# Altium footprint library Dr.Xiong_20160818.PcbLib: 266 footprints (part 15 of 17)
Each footprint in its own frame and in the unit in brackets; x right, y up, seen from the top. Pads: shape width x height; smd on the part's side, far side on the other; paste and mask are expansions set on the pad; w line width, h text height; cw(c..) or ccw(c..) is an arc to the next point about the centre after c.
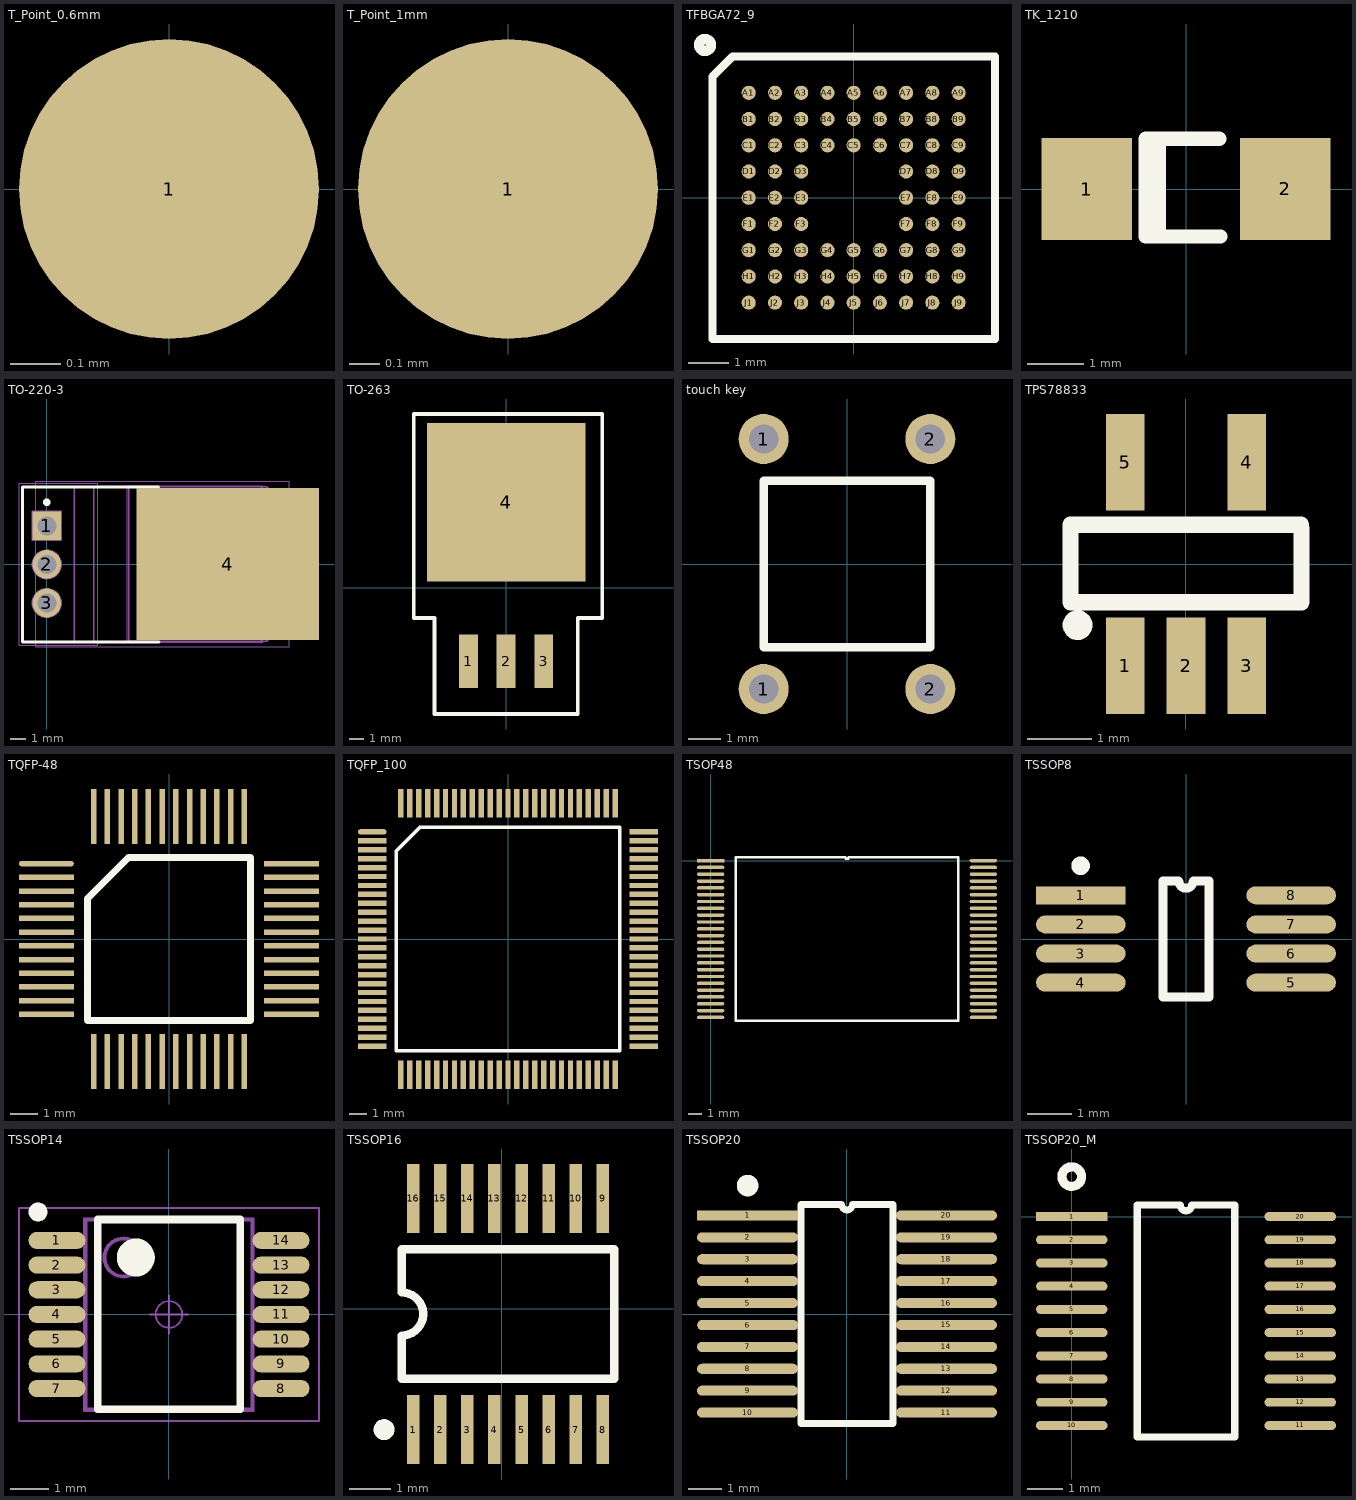
[diagram p14: the footprints below, top view; thin cyan lines are the x and y axes]

## T_Point_0.6mm [mm]
pads (1):
  round 0.6 all layers, no hole: 1(0,0)

## T_Point_1mm [mm]
pads (1):
  round 1 all layers, no hole: 1(0,0)

## TFBGA72_9 [mm]
pads (72):
  round 0.35 smd: A1(-2.6,2.6) A2(-1.95,2.6) A3(-1.3,2.6) A4(-0.65,2.6) A5(0,2.6) A6(0.65,2.6) A7(1.3,2.6) A8(1.95,2.6) A9(2.6,2.6) B1(-2.6,1.95) B2(-1.95,1.95) B3(-1.3,1.95) B4(-0.65,1.95) B5(0,1.95) B6(0.65,1.95) B7(1.3,1.95) B8(1.95,1.95) B9(2.6,1.95) C1(-2.6,1.3) C2(-1.95,1.3) C3(-1.3,1.3) C4(-0.65,1.3) C5(0,1.3) C6(0.65,1.3) C7(1.3,1.3) C8(1.95,1.3) C9(2.6,1.3) D1(-2.6,0.65) D2(-1.95,0.65) D3(-1.3,0.65) D7(1.3,0.65) D8(1.95,0.65) D9(2.6,0.65) E1(-2.6,0) E2(-1.95,0) E3(-1.3,0) E7(1.3,0) E8(1.95,0) E9(2.6,0) F1(-2.6,-0.65) F2(-1.95,-0.65) F3(-1.3,-0.65) F7(1.3,-0.65) F8(1.95,-0.65) F9(2.6,-0.65) G1(-2.6,-1.3) G2(-1.95,-1.3) G3(-1.3,-1.3) G4(-0.65,-1.3) G5(0,-1.3) G6(0.65,-1.3) G7(1.3,-1.3) G8(1.95,-1.3) G9(2.6,-1.3) H1(-2.6,-1.95) H2(-1.95,-1.95) H3(-1.3,-1.95) H4(-0.65,-1.95) H5(0,-1.95) H6(0.65,-1.95) H7(1.3,-1.95) H8(1.95,-1.95) H9(2.6,-1.95) J1(-2.6,-2.6) J2(-1.95,-2.6) J3(-1.3,-2.6) J4(-0.65,-2.6) J5(0,-2.6) J6(0.65,-2.6) J7(1.3,-2.6) J8(1.95,-2.6) J9(2.6,-2.6)
Top Overlay:
  circle w0.254: c-3.683,3.785 r0.148
  lines w0.2: -3.501,3.001 -3.002,3.5 ; -3.5,3 -3.5,-3.5 3.5,-3.5 3.5,3.5 -3,3.5

## TK_1210 [mm]
pads (2):
  rect 1.6x1.8 smd: 1(-1.75,0) 2(1.75,0)
Top Overlay:
  lines w0.254: -0.711,-0.838 -0.076,-0.838 ; -0.711,-0.787 -0.711,0.889 -0.102,0.889 0.305,0.889 ; -0.483,0.864 -0.483,-0.813 -0.457,-0.787 ; -0.102,-0.838 0.33,-0.838 ; 0.203,-0.838 0.61,-0.838 ; 0.279,0.889 0.584,0.889

## TO-220-3 [mm]
pads (4):
  rect 1.9x1.9 / inner round 1.9 / far side rect 1.9x1.9 hole 1.25: 1(0,2.54)
  round 1.9 hole 1.25: 2(0,0) 3(0,-2.54)
  rect 12x10 smd: 4(11.92,0.025)
Top Overlay:
  circle w0.25: c0,4.09 r0.125
  lines w0.2: 3.048,5.09 7.348,5.09 ; 3.1,5.09 -1.6,5.09 -1.6,-5.11 3.1,-5.11 7.4,-5.11
Mechanical 15:
  circle w0.1: c0,-2.54 r0.95
  circle w0.1: c0,0 r0.95
  lines w0.1: 1.82,-5.08 1.82,5.08 ; 14.11,-5.055 5.41,-5.055 5.41,5.105 14.11,5.105 ; 14.11,-5.055 14.11,5.105 ; 14.11,-5.055 14.48,-5.055 15.23,-4.224 15.23,4.274 14.48,5.105 14.11,5.105 ; -1.58,-5.08 -1.58,5.08 3.09,5.08 3.09,-5.08 -1.58,-5.08 ; -0.95,1.59 0.95,1.59 0.95,3.49 -0.95,3.49 -0.95,1.59
Mechanical 16:
  circle w0.05: c0,2.54 r0.35
  circle w0.05: c7.62,0.025 r0.35
  lines w0.001: -1.58,-5.08 -1.58,5.08 3.09,5.08 3.09,-5.08 -1.58,-5.08 ; 5.31,-5.13 14.21,-5.13 14.21,5.18 5.31,5.18 5.31,-5.13
  lines w0.05: -0.5,2.54 0.5,2.54 ; 0,2.04 0,3.04 ; 7.12,0.025 8.12,0.025 ; 7.62,-0.475 7.62,0.525 ; -1.83,-5.33 -1.83,5.33 3.34,5.33 3.34,-5.33 -1.83,-5.33 ; -0.73,-5.425 15.97,-5.425 15.97,5.475 -0.73,5.475 -0.73,-5.425

## TO-263 [mil]
pads (4):
  rect 50x143 smd: 1(-100,-195) 2(0,-195) 3(100,-195)
  rect 420x420 smd: 4(0,227)
Top Overlay:
  lines w10: 255,-80 190,-80 190,-335 -190,-335 -190,-80 -245,-80 -245,461 255,461 255,-75

## touch key [mil]
pads (4):
  round 60 hole 35: 1(-100,-150) 1(-100,150) 2(100,-150) 2(100,150)
Top Overlay:
  lines w10: -100,-100 100,-100 100,100 -100,100 -100,0 -100,-100

## TPS78833 [mm]
pads (5):
  rect 0.6x1.5 smd: 1(-0.95,-1.587) 2(0,-1.587) 3(0.95,-1.587) 4(0.95,1.587) 5(-0.95,1.587)
Top Overlay:
  circle w0.254: c-1.69,-0.953 r0.105
  lines w0.254: 1.742,0.61 1.8,0.553 1.8,-0.597 -1.8,-0.597 -1.8,0.61 1.793,0.61

## TQFP-48 [mil]
pads (48):
  oval 80x8 smd: 1(-179,110)
  rect 80x8 smd: 2(-179,90) 3(-179,70) 4(-179,50) 5(-179,30) 6(-179,10) 7(-179,-10) 8(-179,-30) 9(-179,-50) 10(-179,-70) 11(-179,-90) 12(-179,-110) 25(179,-110) 26(179,-90) 27(179,-70) 28(179,-50) 29(179,-30) 30(179,-10) 31(179,10) 32(179,30) 33(179,50) 34(179,70) 35(179,90) 36(179,110)
  rect 8x80 smd: 13(-110,-179) 14(-90,-179) 15(-70,-179) 16(-50,-179) 17(-30,-179) 18(-10,-179) 19(10,-179) 20(30,-179) 21(50,-179) 22(70,-179) 23(90,-179) 24(110,-179) 37(110,179) 38(90,179) 39(70,179) 40(50,179) 41(30,179) 42(10,179) 43(-10,179) 44(-30,179) 45(-50,179) 46(-70,179) 47(-90,179) 48(-110,179)
Top Overlay:
  lines w10: -119,-119 -119,59 -59,119 119,119 119,-119 -119,-119

## TQFP_100 [mm]
pads (100):
  oval 1.6x0.3 smd: 1(-7.6,6)
  rect 1.6x0.3 smd: 2(-7.6,5.5) 3(-7.6,5) 4(-7.6,4.5) 5(-7.6,4) 6(-7.6,3.5) 7(-7.6,3) 8(-7.6,2.5) 9(-7.6,2) 10(-7.6,1.5) 11(-7.6,1) 12(-7.6,0.5) 13(-7.6,0) 14(-7.6,-0.5) 15(-7.6,-1) 16(-7.6,-1.5) 17(-7.6,-2) 18(-7.6,-2.5) 19(-7.6,-3) 20(-7.6,-3.5) 21(-7.6,-4) 22(-7.6,-4.5) 23(-7.6,-5) 24(-7.6,-5.5) 25(-7.6,-6) 51(7.6,-6) 52(7.6,-5.5) 53(7.6,-5) 54(7.6,-4.5) 55(7.6,-4) 56(7.6,-3.5) 57(7.6,-3) 58(7.6,-2.5) 59(7.6,-2) 60(7.6,-1.5) 61(7.6,-1) 62(7.6,-0.5) 63(7.6,0) 64(7.6,0.5) 65(7.6,1) 66(7.6,1.5) 67(7.6,2) 68(7.6,2.5) 69(7.6,3) 70(7.6,3.5) 71(7.6,4) 72(7.6,4.5) 73(7.6,5) 74(7.6,5.5) 75(7.6,6)
  rect 0.3x1.6 smd: 26(-6,-7.6) 27(-5.5,-7.6) 28(-5,-7.6) 29(-4.5,-7.6) 30(-4,-7.6) 31(-3.5,-7.6) 32(-3,-7.6) 33(-2.5,-7.6) 34(-2,-7.6) 35(-1.5,-7.6) 36(-1,-7.6) 37(-0.5,-7.6) 38(0,-7.6) 39(0.5,-7.6) 40(1,-7.6) 41(1.5,-7.6) 42(2,-7.6) 43(2.5,-7.6) 44(3,-7.6) 45(3.5,-7.6) 46(4,-7.6) 47(4.5,-7.6) 48(5,-7.6) 49(5.5,-7.6) 50(6,-7.6) 76(6,7.6) 77(5.5,7.6) 78(5,7.6) 79(4.5,7.6) 80(4,7.6) 81(3.5,7.6) 82(3,7.6) 83(2.5,7.6) 84(2,7.6) 85(1.5,7.6) 86(1,7.6) 87(0.5,7.6) 88(0,7.6) 89(-0.5,7.6) 90(-1,7.6) 91(-1.5,7.6) 92(-2,7.6) 93(-2.5,7.6) 94(-3,7.6) 95(-3.5,7.6) 96(-4,7.6) 97(-4.5,7.6) 98(-5,7.6) 99(-5.5,7.6) 100(-6,7.6)
Top Overlay:
  lines w0.2: -6.265,-6.265 -6.265,4.93 -4.93,6.265 6.265,6.265 6.265,-6.265 -6.265,-6.265

## TSOP48 [mm]
pads (48):
  rect 2x0.25 smd: 1(0,0)
  oval 2x0.25 smd: 2(0,-0.5) 3(0,-1) 4(0,-1.5) 5(0,-2) 6(0,-2.5) 7(0,-3) 8(0,-3.5) 9(0,-4) 10(0,-4.5) 11(0,-5) 12(0,-5.5) 13(0,-6) 14(0,-6.5) 15(0,-7) 16(0,-7.5) 17(0,-8) 18(0,-8.5) 19(0,-9) 20(0,-9.5) 21(0,-10) 22(0,-10.5) 23(0,-11) 24(0,-11.5) 25(20,-11.5) 26(20,-11) 27(20,-10.5) 28(20,-10) 29(20,-9.5) 30(20,-9) 31(20,-8.5) 32(20,-8) 33(20,-7.5) 34(20,-7) 35(20,-6.5) 36(20,-6) 37(20,-5.5) 38(20,-5) 39(20,-4.5) 40(20,-4) 41(20,-3.5) 42(20,-3) 43(20,-2.5) 44(20,-2) 45(20,-1.5) 46(20,-1) 47(20,-0.5) 48(20,0)
Top Overlay:
  lines w0.2: 1.835,-11.75 18.165,-11.75 18.165,0.25 10.125,0.25 cw(c10,0.25) 9.875,0.25 1.835,0.25 1.835,-11.75

## TSSOP8 [mm]
pads (8):
  rect 2x0.4 smd: 1(-2.35,0.975)
  oval 2x0.4 smd: 2(-2.35,0.325) 3(-2.35,-0.325) 4(-2.35,-0.975) 5(2.35,-0.975) 6(2.35,-0.325) 7(2.35,0.325) 8(2.35,0.975)
Top Overlay:
  circle w0.254: c-2.354,1.635 r0.08
  lines w0.2: -0.515,-1.3 -0.515,1.3 -0.162,1.3 ccw(c0,1.3) 0.162,1.3 0.515,1.3 0.515,-1.3 -0.515,-1.3

## TSSOP14 [mm]
pads (14):
  oval 1.5x0.45 smd: 1(-2.95,1.95) 2(-2.95,1.3) 3(-2.95,0.65) 4(-2.95,0) 5(-2.95,-0.65) 6(-2.95,-1.3) 7(-2.95,-1.95) 8(2.95,-1.95) 9(2.95,-1.3) 10(2.95,-0.65) 11(2.95,0) 12(2.95,0.65) 13(2.95,1.3) 14(2.95,1.95)
Top Overlay:
  circle w0.25: c-3.45,2.7 r0.125
  circle w0.5: c-0.875,1.5 r0.25
  lines w0.2: -1.875,-2.5 -1.875,2.5 1.875,2.5 1.875,-2.5 -1.875,-2.5
Mechanical 15:
  circle w0.1: c-1.2,1.5 r0.5
  lines w0.1: -2.2,-2.5 -2.2,2.5 2.2,2.5 2.2,-2.5 -2.2,-2.5
Mechanical 16:
  circle w0.05: c0,0 r0.35
  lines w0.001: -2.25,-2.55 -2.25,2.55 2.25,2.55 2.25,-2.55 -2.25,-2.55
  lines w0.05: -0.5,0 0.5,0 ; 0,-0.5 0,0.5 ; -3.95,-2.8 -3.95,2.8 3.95,2.8 3.95,-2.8 -3.95,-2.8

## TSSOP16 [mm] "SIP3232"
pads (16):
  rect 0.3x1.65 smd: 1(-2.123,-2.902) 2(-1.473,-2.902) 3(-0.823,-2.902) 4(-0.173,-2.902) 5(0.477,-2.902) 6(1.127,-2.902) 7(1.777,-2.902) 8(2.427,-2.902) 9(2.427,2.648) 10(1.777,2.648) 11(1.127,2.648) 12(0.477,2.648) 13(-0.173,2.648) 14(-0.823,2.648) 15(-1.473,2.648) 16(-2.123,2.648)
Top Overlay:
  circle w0.25: c-2.823,-2.902 r0.125
  lines w0.2: -2.398,-1.677 2.702,-1.677 2.702,1.423 -2.398,1.423 -2.398,0.39 cw(c-2.398,-0.127) -2.398,-0.644 -2.398,-1.677

## TSSOP20 [mm]
pads (20):
  rect 3x0.3 smd: 1(-2.95,2.925)
  oval 3x0.3 smd: 2(-2.95,2.275) 3(-2.95,1.625) 4(-2.95,0.975) 5(-2.95,0.325) 6(-2.946,-0.33) 7(-2.95,-0.975) 8(-2.95,-1.625) 9(-2.95,-2.275) 10(-2.95,-2.925) 11(2.95,-2.925) 12(2.95,-2.275) 13(2.95,-1.625) 14(2.95,-0.975) 15(2.95,-0.325) 16(2.95,0.325) 17(2.95,0.975) 18(2.95,1.625) 19(2.95,2.275) 20(2.95,2.925)
Top Overlay:
  circle w0.381: c-2.949,3.81 r0.13
  lines w0.2: -1.365,-3.25 -1.365,3.25 -0.162,3.25 ccw(c0,3.25) 0.162,3.25 1.365,3.25 1.365,-3.25 -1.365,-3.25

## TSSOP20_M [mm]
pads (20):
  rect 2x0.25 smd: 1(0,0)
  oval 2x0.25 smd: 2(0,-0.65) 3(0,-1.3) 4(0,-1.95) 5(0,-2.6) 6(0,-3.25) 7(0,-3.9) 8(0,-4.55) 9(0,-5.2) 10(0,-5.85) 11(6.4,-5.85) 12(6.4,-5.2) 13(6.4,-4.55) 14(6.4,-3.9) 15(6.4,-3.25) 16(6.4,-2.6) 17(6.4,-1.95) 18(6.4,-1.3) 19(6.4,-0.65) 20(6.4,0)
Top Overlay:
  circle w0.254: c0,1.118 r0.274
  lines w0.2: 1.835,-6.175 1.835,0.325 3.037,0.325 ccw(c3.2,0.325) 3.362,0.325 4.565,0.325 4.565,-6.175 1.835,-6.175